# Altium footprint library Footprints.PcbLib: 105 footprints (part 4 of 7)
Each footprint in its own frame and in the unit in brackets; x right, y up, seen from the top. Pads: shape width x height; smd on the part's side, far side on the other; paste and mask are expansions set on the pad; w line width, h text height; cw(c..) or ccw(c..) is an arc to the next point about the centre after c.
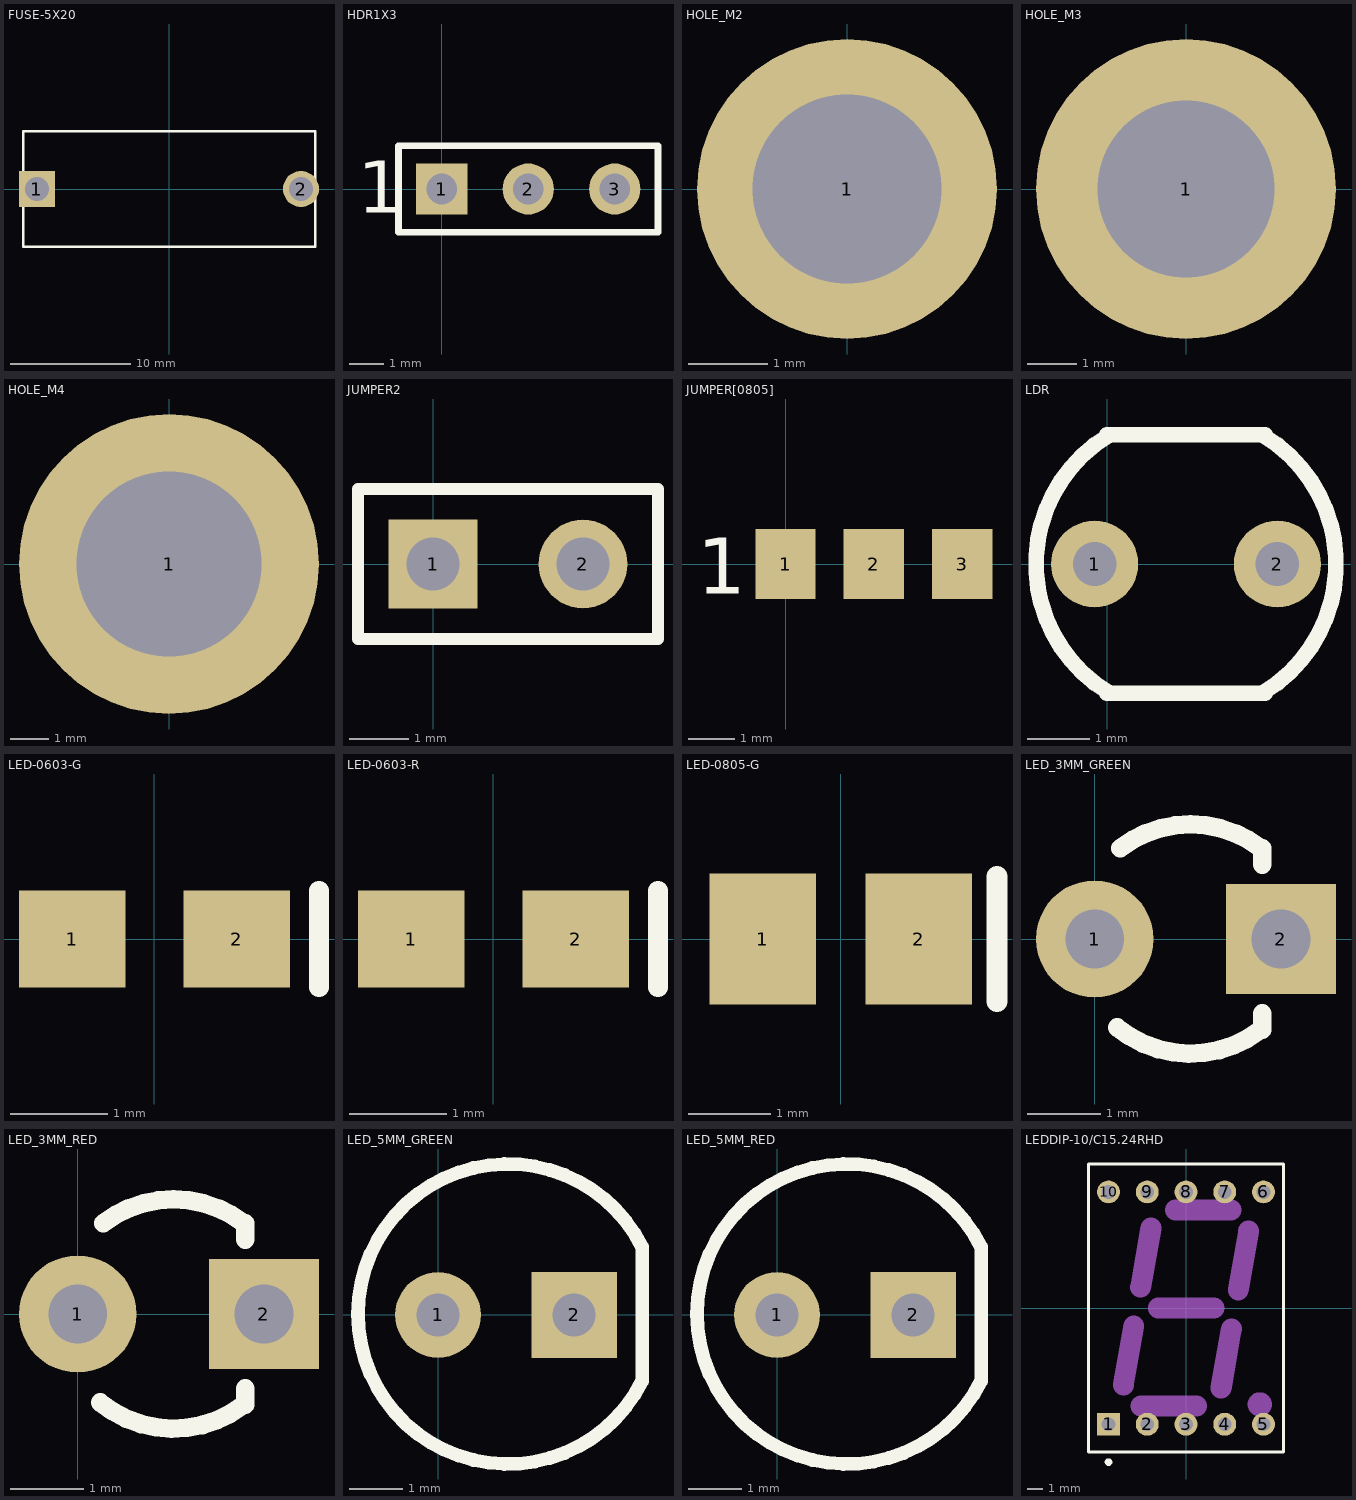
[diagram p3: the footprints below, top view; thin cyan lines are the x and y axes]

## FUSE-5X20 [mm]
height 12.7
pads (2):
  rect 3x3 hole 2: 1(-11,0)
  round 3 hole 2: 2(11,0)
Top Overlay:
  lines w0.2: -12.15,-4.8 12.192,-4.8 12.192,4.8 -12.15,4.8 -12.15,-4.8
3D body "User Library-Fuse_Holder_FH-101-1.STEP": height 10.5, standoff -4.5, extent -12.15,-4.8 12.15,4.8

## HDR1X3 [mm]
pads (3):
  rect 1.5x1.5 hole 0.9: 1(0,0)
  round 1.5 hole 0.9: 2(2.54,0) 3(5.08,0)
Top Overlay:
  lines w0.2: -1.27,-1.27 -1.27,1.27 6.35,1.27 6.35,-1.27 -1.27,-1.27
  text "1" at -2.46,-0.7 h1.52

## HOLE_M2 [mm]
pads (1):
  round 3.8 hole 2.4: 1(0,0)

## HOLE_M3 [mm]
pads (1):
  round 6.1 hole 3.6: 1(0,0)

## HOLE_M4 [mm]
pads (1):
  round 7.8 hole 4.8: 1(0,0)

## JUMPER2 [mm] "Jumper 2 vias"
height 10
pads (2):
  rect 1.5x1.5 hole 0.9: 1(0,0)
  round 1.5 hole 0.9: 2(2.54,0)
Top Overlay:
  lines w0.2: -1.27,-1.27 -1.27,1.27 3.81,1.27 3.81,-1.27 -1.27,-1.27
3D body "Jumper 2.STEP": height 9.5, standoff -2.6, extent -1.225,-1.27 3.775,1.27

## JUMPER[0805] [mm] "0R Chip Resistor Jumper; Body 2.0 x 1.3 mm (LxW typ)"
height 0.65
pads (3):
  rect 1.3x1.5 smd: 1(0,0) 2(1.9,0) 3(3.8,0)
Top Overlay:
  text "1" at -1.905,-0.635 h1.2

## LDR [mm] "VT 900 Series LDR"
height 2
pads (2):
  round 1.4 hole 0.7: 1(-0.2,0) 2(2.74,0)
Top Overlay:
  lines w0.254: 0,-2.08 2.54,-2.08 ; 0,2.08 2.54,2.08 ; 0.013,-2.059 cw(c1.27,0) 0.013,2.059 ; 2.527,-2.059 ccw(c1.27,0) 2.527,2.059
3D body "User Library-LDR.step": height 2.34, standoff -2.4, extent -1.349,-2.134 3.861,2.166

## LED-0603-G [mm] "0603 Green LED"
height 1.3
pads (2):
  rect 1.1x1 smd: 1(-0.85,0) 2(0.85,0)
Top Overlay:
  lines w0.203: 1.7,-0.5 1.7,0.5
3D body "LED_0603_G.STEP": height 0.6, standoff 0, extent -0.8,-0.4 0.8,0.4

## LED-0603-R [mm] "0603 Red LED"
height 1.3
pads (2):
  rect 1.1x1 smd: 1(-0.85,0) 2(0.85,0)
Top Overlay:
  lines w0.203: 1.7,-0.5 1.7,0.5
3D body "LED_0603_R.STEP": height 0.6, standoff 0, extent -0.8,-0.4 0.8,0.4

## LED-0805-G [mm] "0805 LED"
height 1.45
pads (2):
  rect 1.3x1.6 smd: 1(-0.95,0) 2(0.95,0)
Top Overlay:
  lines w0.254: 1.905,-0.762 1.905,0.762
3D body "LED 0805 GREEN.step": height 1.1, standoff 0, extent -1.01,-0.625 1.01,0.625

## LED_3MM_GREEN [mm] "Led 3 mm"
height 4.7
pads (2):
  round 1.6 hole 0.8: 1(0,0)
  rect 1.5x1.5 hole 0.8: 2(2.54,0)
Top Overlay:
  lines w0.254: 0.306,-1.206 ccw(c1.306,0.018) 2.263,-1.239 ; 0.349,1.239 cw(c1.306,-0.018) 2.263,1.24 ; 2.286,-1.239 2.286,-1.016 ; 2.286,1.016 2.286,1.24
3D body "SW3dPS-LEDd3G.STEP": height 5.31, standoff -2.69, extent -0.394,-1.654 2.906,1.646

## LED_3MM_RED [mm] "Led 3 mm"
height 4.7
pads (2):
  round 1.6 hole 0.8: 1(0,0)
  rect 1.5x1.5 hole 0.8: 2(2.54,0)
Top Overlay:
  lines w0.254: 0.306,-1.206 ccw(c1.306,0.018) 2.263,-1.239 ; 0.349,1.239 cw(c1.306,-0.018) 2.263,1.24 ; 2.286,-1.239 2.286,-1.016 ; 2.286,1.016 2.286,1.24
3D body "SW3dPS-LEDd3R.STEP": height 5.31, standoff -2.69, extent -0.381,-1.65 2.919,1.65

## LED_5MM_GREEN [mm] "Led 5 mm"
height 8.3
pads (2):
  round 1.6 hole 0.8: 1(0,0)
  rect 1.6x1.6 hole 0.8: 2(2.54,0)
Top Overlay:
  lines w0.254: 3.81,-1.234 cw(c1.306,0.018) 3.81,1.27 3.81,-1.234
3D body "SW3dPS-LEDd5G.STEP": height 8.81, standoff -5.99, extent -1.71,-3.01 3.711,3.01

## LED_5MM_RED [mm] "Led 5 mm"
height 8.3
pads (2):
  round 1.6 hole 0.8: 1(0,0)
  rect 1.6x1.6 hole 0.8: 2(2.54,0)
Top Overlay:
  lines w0.254: 3.81,-1.234 cw(c1.306,0.018) 3.81,1.27 3.81,-1.234
3D body "ALSRobot-LED Red 5mm.STEP": height 8.81, standoff -5.99, extent -1.71,-3.01 3.711,3.01

## LEDDIP-10/C15.24RHD [mm] "LED, 7-Segment Display, 14.2 mm, RHD; 10 Leads; Row Space 15.24 mm; Pitch 2.54 mm"
height 8.25
pads (10):
  rect 1.5x1.5 hole 0.9: 1(-5.08,-7.62)
  round 1.5 hole 0.9: 2(-2.54,-7.62) 3(0,-7.62) 4(2.54,-7.62) 5(5.08,-7.62) 6(5.08,7.62) 7(2.54,7.62) 8(0,7.62) 9(-2.54,7.62) 10(-5.08,7.62)
Top Overlay:
  circle w0.25: c-5.08,-10.1 r0.125
  lines w0.2: -6.4,-9.45 -6.4,9.45 6.4,9.45 6.4,-9.45 -6.4,-9.45
Mechanical 1:
  circle w1: c4.842,-6.316 r0.296
  lines w1.37: -4.108,-5.054 -3.425,-1.17 ; -2.974,1.368 -2.293,5.255 ; -2.958,-6.429 0.692,-6.426 ; -1.821,0 1.828,0 ; -0.689,6.425 2.96,6.425 ; 2.295,-5.256 2.98,-1.371 ; 3.427,1.169 4.11,5.058
Mechanical 13:
  lines w0.1: -6.4,-9.45 6.4,-9.45 6.4,9.45 -6.4,9.45 -6.4,-9.45
3D body "User Library-7 Segment LED Module (1).step": height 8.1, standoff -3.4, extent -6.175,-9.525 6.125,9.475